# Altium footprint library ICs And Semiconductors THD.PcbLib: 507 footprints (part 22 of 32) (continued)
## MICROSEMI_D1_FLIP [mm] "MICROSEMI D1 Package Module, Body 94mm x 34mm, Screws on PCB Version" (continued)
  text "9" at 48.206,-14.668 h1.5
  text "8" at 48.206,-10.164 h1.5
  text "10" at 48.109,8.011 h1.5
  text "11" at 48.109,12.512 h1.5
  text "6" at -49.796,12.004 h1.5
  text "7" at -49.796,7.503 h1.5
  text "5" at -49.796,-10.037 h1.5
  text "4" at -49.796,-14.541 h1.5
  text "1" at 22.848,9.5 h1.5
  text "2" at -0.647,9.5 h1.5
  text "3" at -23.761,9.5 h1.5
Keep-Out Layer:
  board cut-out: 33.2,-16 33.2,-16.098 33.238,-16.292 33.314,-16.474 33.423,-16.637 33.563,-16.777 33.726,-16.886 33.908,-16.962 34.102,-17 34.2,-17 45.8,-17 45.899,-17 46.092,-16.962 46.274,-16.886 46.437,-16.777 46.577,-16.637 46.686,-16.474 46.762,-16.292 46.8,-16.098 46.8,-16 46.8,16 46.8,16.098 46.762,16.292 46.686,16.474 46.577,16.637 46.437,16.777 46.274,16.886 46.092,16.962 45.899,17 45.8,17 34.2,17 34.102,17 33.908,16.962 33.726,16.886 33.563,16.777 33.423,16.637 33.314,16.474 33.238,16.292 33.2,16.098 33.2,16
  board cut-out: -46.8,-16 -46.8,-16.098 -46.762,-16.292 -46.686,-16.474 -46.577,-16.637 -46.437,-16.777 -46.274,-16.886 -46.092,-16.962 -45.899,-17 -45.8,-17 -34.2,-17 -34.102,-17 -33.908,-16.962 -33.726,-16.886 -33.563,-16.777 -33.423,-16.637 -33.314,-16.474 -33.238,-16.292 -33.2,-16.098 -33.2,-16 -33.2,16 -33.2,16.098 -33.238,16.292 -33.314,16.474 -33.423,16.637 -33.563,16.777 -33.726,16.886 -33.908,16.962 -34.102,17 -34.2,17 -45.8,17 -45.899,17 -46.092,16.962 -46.274,16.886 -46.437,16.777 -46.577,16.637 -46.686,16.474 -46.762,16.292 -46.8,16.098 -46.8,16
Mechanical 1:
  lines w1.27: -46.8,-16 ccw(c-45.8,-16) -45.8,-17 -34.2,-17 ccw(c-34.2,-16) -33.2,-16 -33.2,16 ccw(c-34.2,16) -34.2,17 -45.8,17 ccw(c-45.8,16) -46.8,16 -46.8,-16 ; 33.2,-16 ccw(c34.2,-16) 34.2,-17 45.8,-17 ccw(c45.8,-16) 46.8,-16 46.8,16 ccw(c45.8,16) 45.8,17 34.2,17 ccw(c34.2,16) 33.2,16 33.2,-16
Notvisible:
  drawing of 321 lines, arcs and shapes, not listed
Mechanical 14:
  drawing of 262 lines, arcs and shapes, not listed
  text "9" at 48.206,-14.668 h1.5
  text "8" at 48.206,-10.164 h1.5
  text "10" at 48.109,8.011 h1.5
  text "11" at 48.109,12.512 h1.5
  text "6" at -49.796,12.004 h1.5
  text "7" at -49.796,7.503 h1.5
  text "5" at -49.796,-10.037 h1.5
  text "4" at -49.796,-14.541 h1.5
  text "1" at 22.848,9.5 h1.5
  text "2" at -0.647,9.5 h1.5
  text "3" at -23.761,9.5 h1.5
Drill Drawing:
  lines w0.1: -46.2,5.878 -46.8,6.096 ; -46.2,6.314 -46.8,6.096 ; -43.652,-16.4 -43.434,-17 ; -43.652,16.4 -43.434,17 ; -43.216,-16.4 -43.434,-17 ; -43.216,16.4 -43.434,17 ; -40.5,0 -40,0 ; -40,-0.5 -40,0 ; -40,0.5 -40,0 ; -39.5,0 -40,0 ; -39.37,-15.886 -34.152,-15.886 -33.401,-16.637 ; -34.307,-16.214 -33.401,-16.637 ; -33.824,-15.731 -33.401,-16.637 ; -33.8,5.878 -33.2,6.096 ; -33.8,6.314 -33.2,6.096 ; 33.8,5.878 33.2,6.096 ; 33.8,6.314 33.2,6.096 ; 36.348,-16.4 36.566,-17 ; 36.348,16.4 36.566,17 ; 36.784,-16.4 36.566,-17 ; 36.784,16.4 36.566,17 ; 39.5,0 40,0 ; 40,-0.5 40,0 ; 40,0.5 40,0 ; 40.5,0 40,0 ; 40.63,-15.886 45.848,-15.886 46.599,-16.637 ; 45.693,-16.214 46.599,-16.637 ; 46.176,-15.731 46.599,-16.637 ; 46.2,5.878 46.8,6.096 ; 46.2,6.314 46.8,6.096 ; -46.8,6.096 -33.2,6.096 ; -43.434,-17 -43.434,17 ; 33.2,-16 ccw(c34.2,-16) 34.2,-17 ; 33.2,-16 ccw(c34.2,-16) 34.2,-17 ; 33.2,-16 33.2,16 ; 33.2,-16 33.2,16 ; 33.2,6.096 46.8,6.096 ; 33.2,16 cw(c34.2,16) 34.2,17 ; 33.2,16 cw(c34.2,16) 34.2,17 ; 34.2,-17 45.8,-17 ; 34.2,-17 45.8,-17 ; 34.2,17 45.8,17 ; 34.2,17 45.8,17 ; 36.566,-17 36.566,17 ; 45.8,-17 ccw(c45.8,-16) 46.8,-16 ; 45.8,-17 ccw(c45.8,-16) 46.8,-16 ; 45.8,17 cw(c45.8,16) 46.8,16 ; 45.8,17 cw(c45.8,16) 46.8,16 ; 46.8,-16 46.8,16 ; 46.8,-16 46.8,16 ; -46.8,-16 ccw(c-45.8,-16) -45.8,-17 -34.2,-17 ccw(c-34.2,-16) -33.2,-16 -33.2,16 ccw(c-34.2,16) -34.2,17 -45.8,17 ccw(c-45.8,16) -46.8,16 -46.8,-16
  text "34mm" at -43.942,-0.635 h0.9
  text "13.6mm" at -39.243,6.604 h0.9
  text "r =1mm" at -39.243,-15.621 h0.9
  text "r =1mm" at 40.757,-15.621 h0.9
  text "13.6mm" at 40.757,6.604 h0.9
  text "34mm" at 36.058,-0.635 h0.9
3D body "MICROSEMI_D1_FLIP_Part2.stp": height 10.4, standoff -5.27, extent -27.75,-4.75 27.75,4.75
3D body "MICROSEMI_D1_FLIP_Part1.stp": height 30.51, standoff 0, extent -47,-16.906 47,16.894

## MICROSEMI_SOT-227_FLIP [mm] "MICROSEMI SOT-227 (ISOTOP) Case, Body 38.2mm x 25.4mm, Screws on PCB Version"
height 12.2
pads (4):
  rrect50% 9.5x9.5 hole 4.4: 1(7.5,6.35) 2(-7.5,6.35) 3(-7.5,-6.35) 4(7.5,-6.35)
via -4.75,-4.763 diameter 1 hole 0.5
via -7.5,-3.175 diameter 1 hole 0.5
via -10.25,-4.763 diameter 1 hole 0.5
via -10.25,-7.938 diameter 1 hole 0.5
via -7.5,-9.525 diameter 1 hole 0.5
via -4.75,-7.938 diameter 1 hole 0.5
via 10.25,-4.763 diameter 1 hole 0.5
via 7.5,-3.175 diameter 1 hole 0.5
via 4.75,-4.763 diameter 1 hole 0.5
via 4.75,-7.938 diameter 1 hole 0.5
via 7.5,-9.525 diameter 1 hole 0.5
via 10.25,-7.938 diameter 1 hole 0.5
via -4.75,7.938 diameter 1 hole 0.5
via -7.5,9.525 diameter 1 hole 0.5
via -10.25,7.938 diameter 1 hole 0.5
via -10.25,4.763 diameter 1 hole 0.5
via -7.5,3.175 diameter 1 hole 0.5
via -4.75,4.763 diameter 1 hole 0.5
via 10.25,7.938 diameter 1 hole 0.5
via 7.5,9.525 diameter 1 hole 0.5
via 4.75,7.938 diameter 1 hole 0.5
via 4.75,4.763 diameter 1 hole 0.5
via 7.5,3.175 diameter 1 hole 0.5
via 10.25,4.763 diameter 1 hole 0.5
Top Overlay:
  circle w0.2: c-15.1,0 r2.15
  lines w0.2: -15.85,-11.521 -15.85,-12.479 ; -15.85,-10.521 -15.85,-9.521 ; -15.85,9.479 -15.85,10.479 ; -15.85,11.479 -15.85,12.479 ; -15.628,-8.521 -15.043,-7.521 ; -15.603,8.479 -15.018,7.479 ; -14.457,-6.521 -13.871,-5.521 ; -14.432,6.479 -13.847,5.479 ; -13.286,-4.521 -12.7,-3.521 ; -13.261,4.479 -12.676,3.479 ; -12.115,-2.521 -11.778,-1.945 ccw(c-15.1,0) -11.563,-1.521 ; -12.09,2.479 -11.778,1.945 cw(c-15.1,0) -11.545,1.479 ; -11.285,-0.521 ccw(c-15.1,0) -11.28,0.479 ; 11.28,0.479 ccw(c15.1,0) 11.285,-0.521 ; 11.545,1.479 cw(c15.1,0) 11.778,1.945 12.09,2.479 ; 11.563,-1.521 ccw(c15.1,0) 11.778,-1.945 12.115,-2.521 ; 12.676,3.479 13.261,4.479 ; 12.7,-3.521 13.286,-4.521 ; 13.847,5.479 14.432,6.479 ; 13.871,-5.521 14.457,-6.521 ; 15.018,7.479 15.603,8.479 ; 15.043,-7.521 15.628,-8.521 ; 15.85,-11.521 15.85,-12.479 ; 15.85,-10.521 15.85,-9.521 ; 15.85,9.479 15.85,10.479 ; 15.85,11.479 15.85,12.479 ; -15.85,-12.479 -17.5,-12.479 -19.1,-10.879 -19.1,10.879 -17.5,12.479 -15.85,12.479 ; -15.85,-12.479 15.85,-12.479 ; -15.85,12.479 15.85,12.479 ; 15.1,-2.15 cw(c15.1,0) 15.1,2.15 ; 15.1,-2.15 19.1,-2.15 ; 15.1,-2.15 19.1,-2.15 ; 15.1,2.15 19.1,2.15 ; 15.1,2.15 19.1,2.15 ; 15.85,-12.479 17.5,-12.479 19.1,-10.879 19.1,-2.15 ; 15.85,12.479 17.5,12.479 19.1,10.879 19.1,2.15
Notvisible:
  lines w0.1: -15.1,0 -16.1,0 -15.1,0 ; -15.1,0 -14.1,0 -15.1,0 ; -15.1,0 -15.1,1 -15.1,0 ; -15.1,0 -15.1,-1 -15.1,0 ; -7.5,-6.35 -8.5,-6.35 -7.5,-6.35 ; -7.5,-6.35 -6.5,-6.35 -7.5,-6.35 ; -7.5,-6.35 -7.5,-5.35 -7.5,-6.35 ; -7.5,-6.35 -7.5,-7.35 -7.5,-6.35 ; -7.5,6.35 -8.5,6.35 -7.5,6.35 ; -7.5,6.35 -6.5,6.35 -7.5,6.35 ; -7.5,6.35 -7.5,7.35 -7.5,6.35 ; -7.5,6.35 -7.5,5.35 -7.5,6.35 ; 0,0 -1,0 0,0 ; 0,0 1,0 0,0 ; 0,0 0,1 0,0 ; 0,0 0,-1 0,0 ; 7.5,-6.35 6.5,-6.35 7.5,-6.35 ; 7.5,-6.35 8.5,-6.35 7.5,-6.35 ; 7.5,-6.35 7.5,-5.35 7.5,-6.35 ; 7.5,-6.35 7.5,-7.35 7.5,-6.35 ; 7.5,6.35 6.5,6.35 7.5,6.35 ; 7.5,6.35 8.5,6.35 7.5,6.35 ; 7.5,6.35 7.5,7.35 7.5,6.35 ; 7.5,6.35 7.5,5.35 7.5,6.35 ; 15.1,0 14.1,0 15.1,0 ; 15.1,0 16.1,0 15.1,0 ; 15.1,0 15.1,1 15.1,0 ; 15.1,0 15.1,-1 15.1,0
Mechanical 14:
  circle w0.1: c-15.1,0 r2.15
  circle w0.1: c-7.5,-6.35 r2.2
  circle w0.1: c7.5,-6.35 r2.2
  circle w0.1: c7.5,6.35 r2.2
  circle w0.1: c-7.5,6.35 r2.2
  lines w0.1: -15.85,-11.521 -15.85,-12.479 ; -15.85,-10.521 -15.85,-9.521 ; -15.85,9.479 -15.85,10.479 ; -15.85,11.479 -15.85,12.479 ; -15.628,-8.521 -15.043,-7.521 ; -15.603,8.479 -15.018,7.479 ; -14.457,-6.521 -13.871,-5.521 ; -14.432,6.479 -13.847,5.479 ; -13.286,-4.521 -12.7,-3.521 ; -13.261,4.479 -12.676,3.479 ; -12.115,-2.521 -11.778,-1.945 ccw(c-15.1,0) -11.563,-1.521 ; -12.09,2.479 -11.778,1.945 cw(c-15.1,0) -11.545,1.479 ; -11.5,-10.521 -11.5,-11.314 -11.1,-11.314 ; -11.5,-9.521 -11.5,-8.521 ; -11.5,-7.521 -11.5,-6.521 ; -11.5,-5.521 -11.5,-4.521 ; -11.5,-3.521 -11.5,-3.342 ; -11.5,3.479 -11.5,3.342 -10.637,2.479 ; -11.5,4.479 -11.5,5.479 ; -11.5,6.479 -11.5,7.479 ; -11.5,8.479 -11.5,9.479 ; -11.5,10.479 -11.5,11.314 -11.1,11.314 ; -11.285,-0.521 ccw(c-15.1,0) -11.28,0.479 ; -10.1,-11.314 -9.1,-11.314 ; -10.1,11.314 -9.1,11.314 ; -10,1.842 -9.1,1.842 ; -8.1,-11.314 -7.1,-11.314 ; -8.1,1.842 -7.1,1.842 ; -8.1,11.314 -7.1,11.314 ; -6.1,-11.314 -5.1,-11.314 ; -6.1,1.842 -5.1,1.842 ; -6.1,11.314 -5.1,11.314 ; -5.1,-1.842 -6.1,-1.842 -5,-1.842 ; -4.363,2.479 -3.5,3.342 -3.5,3.479 ; -4.1,-11.314 -3.5,-11.314 -3.5,-10.521 ; -4.1,11.314 -3.5,11.314 -3.5,10.479 ; -3.5,-9.521 -3.5,-8.521 ; -3.5,-7.521 -3.5,-6.521 ; -3.5,-5.521 -3.5,-4.521 ; -3.5,-3.521 -3.5,-3.342 ; -3.5,4.479 -3.5,5.479 ; -3.5,6.479 -3.5,7.479 ; -3.5,8.479 -3.5,9.479 ; 3.5,-10.521 3.5,-11.314 3.9,-11.314 ; 3.5,-9.521 3.5,-8.521 ; 3.5,-7.521 3.5,-6.521 ; 3.5,-5.521 3.5,-4.521 ; 3.5,-3.521 3.5,-3.342 4.321,-2.521 ; 3.5,3.479 3.5,3.342 4.363,2.479 ; 3.5,4.479 3.5,5.479 ; 3.5,6.479 3.5,7.479 ; 3.5,8.479 3.5,9.479 ; 3.5,10.479 3.5,11.314 3.9,11.314 ; 4.9,-11.314 5.9,-11.314 ; 4.9,11.314 5.9,11.314 ; 5,-1.842 5.9,-1.842 ; 5,1.842 5.9,1.842 ; 6.9,-11.314 7.9,-11.314 ; 6.9,-1.842 7.9,-1.842 ; 6.9,1.842 7.9,1.842 ; 6.9,11.314 7.9,11.314 ; 8.9,-11.314 9.9,-11.314 ; 8.9,-1.842 9.9,-1.842 ; 8.9,1.842 9.9,1.842 ; 8.9,11.314 9.9,11.314 ; 10.637,2.479 11.5,3.342 11.5,3.479 ; 10.679,-2.521 11.5,-3.342 11.5,-3.521 ; 10.9,-11.314 11.5,-11.314 11.5,-10.521 ; 10.9,11.314 11.5,11.314 11.5,10.479 ; 11.28,0.479 ccw(c15.1,0) 11.285,-0.521 ; 11.5,-9.521 11.5,-8.521 ; 11.5,-7.521 11.5,-6.521 ; 11.5,-5.521 11.5,-4.521 ; 11.5,4.479 11.5,5.479 ; 11.5,6.479 11.5,7.479 ; 11.5,8.479 11.5,9.479 ; 11.545,1.479 cw(c15.1,0) 11.778,1.945 12.09,2.479 ; 11.563,-1.521 ccw(c15.1,0) 11.778,-1.945 12.115,-2.521 ; 12.676,3.479 13.261,4.479 ; 12.7,-3.521 13.286,-4.521 ; 13.847,5.479 14.432,6.479 ; 13.871,-5.521 14.457,-6.521 ; 15.018,7.479 15.603,8.479 ; 15.043,-7.521 15.628,-8.521 ; 15.85,-11.521 15.85,-12.479 ; 15.85,-10.521 15.85,-9.521 ; 15.85,9.479 15.85,10.479 ; 15.85,11.479 15.85,12.479 ; -15.85,-12.479 15.85,-12.479 ; -15.85,-12.479 -17.5,-12.479 -19.1,-10.879 -19.1,10.879 -17.5,12.479 -15.85,12.479 ; -15.85,12.479 15.85,12.479 ; -11.5,-3.342 -10.679,-2.521 -11.5,-3.342 ; -3.5,-3.342 -4.321,-2.521 -3.5,-3.342 ; 15.1,-2.15 cw(c15.1,0) 15.1,2.15 ; 15.1,-2.15 19.1,-2.15 ; 15.1,-2.15 19.1,-2.15 ; 15.1,2.15 19.1,2.15 ; 15.1,2.15 19.1,2.15 ; 15.85,-12.479 17.5,-12.479 19.1,-10.879 19.1,-2.15 ; 15.85,12.479 17.5,12.479 19.1,10.879 19.1,2.15 ; -10,-1.842 -9.1,-1.842 -10,-1.842 ; -8.1,-1.842 -7.1,-1.842 -8.1,-1.842
3D body "MICROSEMI_ISOTOP_FLIP_Part1.stp": height 12.04, standoff 0, extent -19.1,-12.479 19.1,12.479
3D body "MICROSEMI_ISOTOP_FLIP_Part2.stp": height 10.24, standoff -4.69, extent -11.5,-10.365 11.5,10.365

## MINI-CIRCUITS_CY353 [mm] "MINI-CIRCUITS CY353 Case, Body 82.3mm L X 38.1mm W X 15.75mm H"
height 15.75
pads (2):
  round 10 hole 5.5: CASE(-33.274,0) CASE(33.274,0)
Top Layer:
  rectangle: -41.548,-19.45 41.548,19.45
Top Overlay:
  drawing of 346 lines, arcs and shapes, not listed
  text "6" at 18.6,-22.2 h1.5
  text "5" at 5.8,-22.2 h1.5
  text "4" at -6.9,-22.2 h1.5
  text "3" at -19.6,-22.2 h1.5
  text "2" at 12.2,20.7 h1.5
  text "1" at -12.9,20.7 h1.5
Notvisible:
  lines w0.05: -33.774,0 -33.274,0 ; -33.274,-0.5 -33.274,0 ; -33.274,0.5 -33.274,0 ; -32.774,0 -33.274,0 ; -12.7,18.05 -12.7,19.05 ; -6.35,-19.05 -6.35,-18.05 ; -0.5,0 0,0 ; 0,-0.5 0,0 ; 0,0.5 0,0 ; 0.5,0 0,0 ; 6.35,-19.05 6.35,-18.05 ; 19.05,-19.05 19.05,-18.05 ; 32.774,0 33.274,0 ; 33.274,-0.5 33.274,0 ; 33.274,0.5 33.274,0 ; 33.774,0 33.274,0 ; -41.548,-19.45 41.548,-19.45 41.548,19.45 -41.548,19.45 -41.548,-19.45 ; -19.05,-19.05 -19.05,-18.05 -19.05,-19.05 ; 12.7,18.05 12.7,19.05 12.7,18.05
Mechanical 14:
  drawing of 350 lines, arcs and shapes, not listed
3D body "MINI-CIRCUITS_CY353.stp": height 15.8, standoff 0, extent -41.148,-29.05 41.148,29.05

## MINI-CIRCUITS_CY1481 [mm] "MINI-CIRCUITS CY1481 Case, Body 82.3mm L X 38.1mm W X 17.53mm H"
height 17.53
pads (2):
  round 12 hole 6.3: CASE(-33.28,0) CASE(33.28,0)
Top Layer:
  rectangle: -41.5,-19.4 41.5,19.4
Top Overlay:
  drawing of 218 lines, arcs and shapes, not listed
  text "2" at 12.2,20.8 h1.5
  text "1" at -12.9,20.7 h1.5
  text "3" at -19.6,-22.2 h1.5
  text "6" at 18.6,-22.2 h1.5
  text "4" at -6.9,-22.2 h1.5
  text "5" at 5.8,-22.2 h1.5
Notvisible:
  lines w0.05: -33.78,0 -33.28,0 ; -33.28,-0.5 -33.28,0 ; -33.28,0.5 -33.28,0 ; -32.78,0 -33.28,0 ; -0.5,0 0,0 ; 0,-0.5 0,0 ; 0,0.5 0,0 ; 0.5,0 0,0 ; 32.78,0 33.28,0 ; 33.28,-0.5 33.28,0 ; 33.28,0.5 33.28,0 ; 33.78,0 33.28,0
Mechanical 14:
  drawing of 224 lines, arcs and shapes, not listed
3D body "MINI-CIRCUITS_CY1481.stp": height 17.53, standoff 0, extent -41.15,-29.05 41.15,29.05

## MINI-CIRCUITS_JJ77 [mm] "10 to 2500MHZ, 50 Ohm SPDT Pin Diode Reflective"
height 24.64
pads (4):
  round 7 hole 3.5: 1(-27.81,-10.795) 1(-27.81,10.795) 1(27.81,-10.795) 1(27.81,10.795)
Top Layer:
  rectangle: -32.15,-14.75 32.15,14.75
Top Overlay:
  drawing of 175 lines, arcs and shapes, not listed
Notvisible:
  circle w0.1: c27.81,-10.795 r1.9
  circle w0.1: c27.81,10.795 r1.9
  circle w0.1: c-27.81,10.795 r1.9
  circle w0.1: c-27.81,-10.795 r1.9
  lines w0.1: -28.31,-10.795 -27.81,-10.795 ; -28.31,10.795 -27.81,10.795 ; -27.81,-11.295 -27.81,-10.795 ; -27.81,-10.295 -27.81,-10.795 ; -27.81,10.295 -27.81,10.795 ; -27.81,11.295 -27.81,10.795 ; -27.31,-10.795 -27.81,-10.795 ; -27.31,10.795 -27.81,10.795 ; -0.5,0 0,0 ; 0,-0.5 0,0 ; 0,0.5 0,0 ; 0.5,0 0,0 ; 27.31,-10.795 27.81,-10.795 ; 27.31,10.795 27.81,10.795 ; 27.81,-11.295 27.81,-10.795 ; 27.81,-10.295 27.81,-10.795 ; 27.81,10.295 27.81,10.795 ; 27.81,11.295 27.81,10.795 ; 28.31,-10.795 27.81,-10.795 ; 28.31,10.795 27.81,10.795 ; -32.15,-14.75 -32.15,14.75 32.15,14.75 32.15,-14.75 -32.15,-14.75
Mechanical 14:
  drawing of 245 lines, arcs and shapes, not listed
  text "RF-2" at 6.025,-13.575 h1.2
  text "RF-1" at -9.975,-13.575 h1.2
  text "RF-IN" at -3.1,11.975 h1.2
  text "GND" at -28.45,-1.725 h1.2
  text "CTRL1" at -31.375,2.9 h1.2
  text "CTRL2" at 25.725,2.775 h1.2
  text "GND" at 25.35,-1.625 h1.2
3D body "MINI-CIRCUITS_JJ77.stp": height 24.69, standoff 0, extent -31.75,-24.35 31.75,24.35

## MINI-CIRCUITS_ZZ1322 [mm] "MINI-CIRCUITS ZZ1322 Case, With Bracket (Option \"B\"), Body 55.37mm L X 31.75mm W X 19.3mm H"
height 19.3
pads (4):
  round 7 hole 3.5: CASE(-21.438,-9.525) CASE(-21.438,9.525) CASE(21.438,-9.525) CASE(21.438,9.525)
Top Layer:
  rectangle: -28.086,-16.275 28.086,16.275
Top Overlay:
  drawing of 232 lines, arcs and shapes, not listed
  text "4" at -8.17,-19.025 h1.5
  text "2" at 7.12,17.525 h1.5
  text "1" at -7.82,17.525 h1.5
  text "3" at 7.07,-19.025 h1.5
Notvisible:
  lines w0.05: -21.938,-9.525 -21.438,-9.525 ; -21.938,9.525 -21.438,9.525 ; -21.438,-10.025 -21.438,-9.525 ; -21.438,-9.025 -21.438,-9.525 ; -21.438,9.025 -21.438,9.525 ; -21.438,10.025 -21.438,9.525 ; -20.938,-9.525 -21.438,-9.525 ; -20.938,9.525 -21.438,9.525 ; -0.5,0 0,0 ; 0,-0.5 0,0 ; 0,0.5 0,0 ; 0.5,0 0,0 ; 20.938,-9.525 21.438,-9.525 ; 20.938,9.525 21.438,9.525 ; 21.438,-10.025 21.438,-9.525 ; 21.438,-9.025 21.438,-9.525 ; 21.438,9.025 21.438,9.525 ; 21.438,10.025 21.438,9.525 ; 21.938,-9.525 21.438,-9.525 ; 21.938,9.525 21.438,9.525 ; -28.086,-16.275 28.086,-16.275 28.086,16.275 -28.086,16.275 -28.086,-16.275
Mechanical 14:
  drawing of 261 lines, arcs and shapes, not listed
3D body "MINI-CIRCUITS_ZZ1322.stp": height 19.35, standoff 0, extent -27.686,-25.875 27.686,25.875

## MQ-3_B [mm] "6 Leads Alcohol Sensor, Body Dia. 16.8mm, Body Height 10mm, Lead Spacing Diameter 9.5mm"
height 10
pads (6):
  round 2 hole 1.3: A1(-3.359,3.359) A2(3.359,3.359) B1(-3.359,-3.359) B2(3.359,-3.359) H1(0,4.75) H2(0,-4.75)
Top Overlay:
  circle w0.2: c0,0 r8.65
Notvisible:
  lines w0.1: -3.712,-3.712 -3.359,-3.359 ; -3.712,-3.005 -3.359,-3.359 ; -3.712,3.005 -3.359,3.359 ; -3.712,3.712 -3.359,3.359 ; -3.005,-3.712 -3.359,-3.359 ; -3.005,-3.005 -3.359,-3.359 ; -3.005,3.005 -3.359,3.359 ; -3.005,3.712 -3.359,3.359 ; -0.5,-4.75 0,-4.75 ; -0.5,0 0,0 ; -0.5,4.75 0,4.75 ; 0,-5.25 0,-4.75 ; 0,-4.25 0,-4.75 ; 0,-0.5 0,0 ; 0,0.5 0,0 ; 0,4.25 0,4.75 ; 0,5.25 0,4.75 ; 0.5,-4.75 0,-4.75 ; 0.5,0 0,0 ; 0.5,4.75 0,4.75 ; 3.005,-3.712 3.359,-3.359 ; 3.005,-3.005 3.359,-3.359 ; 3.005,3.005 3.359,3.359 ; 3.005,3.712 3.359,3.359 ; 3.712,-3.712 3.359,-3.359 ; 3.712,-3.005 3.359,-3.359 ; 3.712,3.005 3.359,3.359 ; 3.712,3.712 3.359,3.359
Mechanical 14:
  circle w0.1: c0,0 r8.65
  circle w0.1: c0,0 r5
3D body "MQ-3_B.stp": height 10, standoff -3.6, extent -8.65,-8.633 8.65,8.633

## MURATA_56000 [mm] "MURATA Current Sensing Transformer, Body 16.79x8.89mm, 5600 Serie"
height 20.19
pads (3):
  round 2.3 hole 1.6: 1(-6.35,-0.386) 2(0,-0.386) 3(6.35,-0.386)
Top Overlay:
  lines w0.2: -3.25,-1.55 -3.25,0.95 ; -3.25,0.95 -3.75,-0.05 -2.75,-0.05 -3.25,0.95 ; -8.395,-4.445 -8.395,4.445 8.395,4.445 8.395,-4.445 -8.395,-4.445
  text "1" at -6.865,-6 h1
  text "2" at -0.515,-6 h1
  text "3" at 5.835,-6 h1
Notvisible:
  lines w0.1: -6.85,-0.386 -6.35,-0.386 ; -6.35,-0.886 -6.35,-0.386 ; -6.35,0.114 -6.35,-0.386 ; -5.85,-0.386 -6.35,-0.386 ; -0.5,-0.386 0,-0.386 ; -0.5,0 0,0 ; 0,-0.886 0,-0.386 ; 0,0.5 0,0 ; 0.5,-0.386 0,-0.386 ; 0.5,0 0,0 ; 5.85,-0.386 6.35,-0.386 ; 6.35,-0.886 6.35,-0.386 ; 6.35,0.114 6.35,-0.386 ; 6.85,-0.386 6.35,-0.386
Mechanical 14:
  lines w0.1: -3.25,-1.55 -3.25,0.95 ; -3.25,0.95 -2.75,-0.05 -3.75,-0.05 -3.25,0.95 ; -8.395,-4.445 -8.395,4.445 8.395,4.445 8.395,-4.445 -8.395,-4.445
  text "1" at -6.865,-6 h1
  text "2" at -0.515,-6 h1
  text "3" at 5.835,-6 h1
3D body "SENS_MURATA_56000.stp": height 20.19, standoff -3.6, extent -8.395,-4.445 8.395,4.445

## NTE_TO-3PML_v [mm] "NTE TO-3PML 3-Terminal - Vertical Mount"
height 26
pads (3):
  rect 2.1x2.1 hole 1.4: 1(-5.45,0)
  round 2.1 hole 1.4: 2(0,0) 3(5.45,0)
Top Overlay:
  lines w0.2: -8,1.8 0,1.8 8,1.8 ; -8,1.8 -7.568,-1.8 0,-1.8 7.568,-1.8 8,1.8 ; -8,1.8 -7.76,3.8 0,3.8 7.76,3.8 8,1.8
Notvisible:
  lines w0.1: -5.95,0 -5.45,0 ; -5.45,-0.5 -5.45,0 ; -5.45,0.5 -5.45,0 ; -4.95,0 -5.45,0 ; -0.5,0 0,0 ; 0,-0.5 0,0 ; 0,0.5 0,0 ; 0.5,0 0,0 ; 4.95,0 5.45,0 ; 5.45,-0.5 5.45,0 ; 5.45,0.5 5.45,0 ; 5.95,0 5.45,0
Mechanical 14:
  lines w0.1: -8,1.8 0,1.8 8,1.8 ; -8,1.8 -7.568,-1.8 0,-1.8 7.568,-1.8 8,1.8 ; -8,1.8 -7.76,3.8 0,3.8 7.76,3.8 8,1.8
3D body "NTE_TO-3PML.stp": height 28, standoff -4, extent -8,-1.8 8,3.8

## ONSEMI_CASE 017AA-01 [mm] "ONSEMICONDUCTOR CASE 017AA-01, Diode, Axial; Lead Spacing 15.24mm, Lead Dia. 1.09mm, Body Length 8.89mm, Body Dia. 3.68mm"
height 3.68
pads (2):
  round 2.1 hole 1.4: 1(-7.62,0) 2(7.62,0)
Top Overlay:
  lines w0.2: -6.33,-0.545 -4.445,-0.545 ; -6.33,0.545 -4.445,0.545 ; -2.945,-1.84 -2.945,1.84 ; -2.77,-1.84 -2.77,1.84 ; -2.62,-1.84 -2.62,1.84 ; -2.495,-1.84 -2.495,1.84 ; -2.295,-1.84 -2.295,1.84 ; -2.12,-1.84 -2.12,1.84 ; -1.945,-1.84 -1.945,1.84 ; 4.445,-0.545 6.33,-0.545 ; 4.445,0.545 6.33,0.545 ; -4.445,-1.84 4.445,-1.84 4.445,1.84 -4.445,1.84 -4.445,-1.84
Notvisible:
  lines w0.1: -8.12,0 -7.62,0 ; -7.62,-0.5 -7.62,0 ; -7.62,0.5 -7.62,0 ; -7.12,0 -7.62,0 ; -0.5,0 0,0 ; 0,-0.5 0,0 ; 0,0.5 0,0 ; 0.5,0 0,0 ; 7.12,0 7.62,0 ; 7.62,-0.5 7.62,0 ; 7.62,0.5 7.62,0 ; 8.12,0 7.62,0
Mechanical 14:
  lines w0.1: -4.445,-0.545 -7.62,-0.545 cw(c-7.62,0) -7.62,0.545 -4.445,0.545 ; -2.945,-1.84 -2.945,1.84 ; -2.845,-1.84 -2.845,1.84 ; -2.77,-1.84 -2.77,1.84 ; -2.695,-1.84 -2.695,1.84 ; -2.62,-1.84 -2.62,1.84 ; -2.545,-1.84 -2.545,1.84 ; -2.47,-1.84 -2.47,1.84 ; -2.37,-1.84 -2.37,1.84 ; -2.295,-1.84 -2.295,1.84 ; -2.195,-1.84 -2.195,1.84 ; -2.12,-1.84 -2.12,1.84 ; -2.045,-1.84 -2.045,1.84 ; -1.945,-1.84 -1.945,1.84 ; 4.445,-0.545 7.62,-0.545 ccw(c7.62,0) 7.62,0.545 4.445,0.545 ; -4.445,-1.84 4.445,-1.84 4.445,1.84 -4.445,1.84 -4.445,-1.84
3D body "ON SEMI_CASE 017AA-01.stp": height 3.68, standoff -3.6, extent -8.165,-1.84 8.165,1.84